# Altium integrated library all_in_one_library.IntLib: 677 symbols (part 3 of 3)
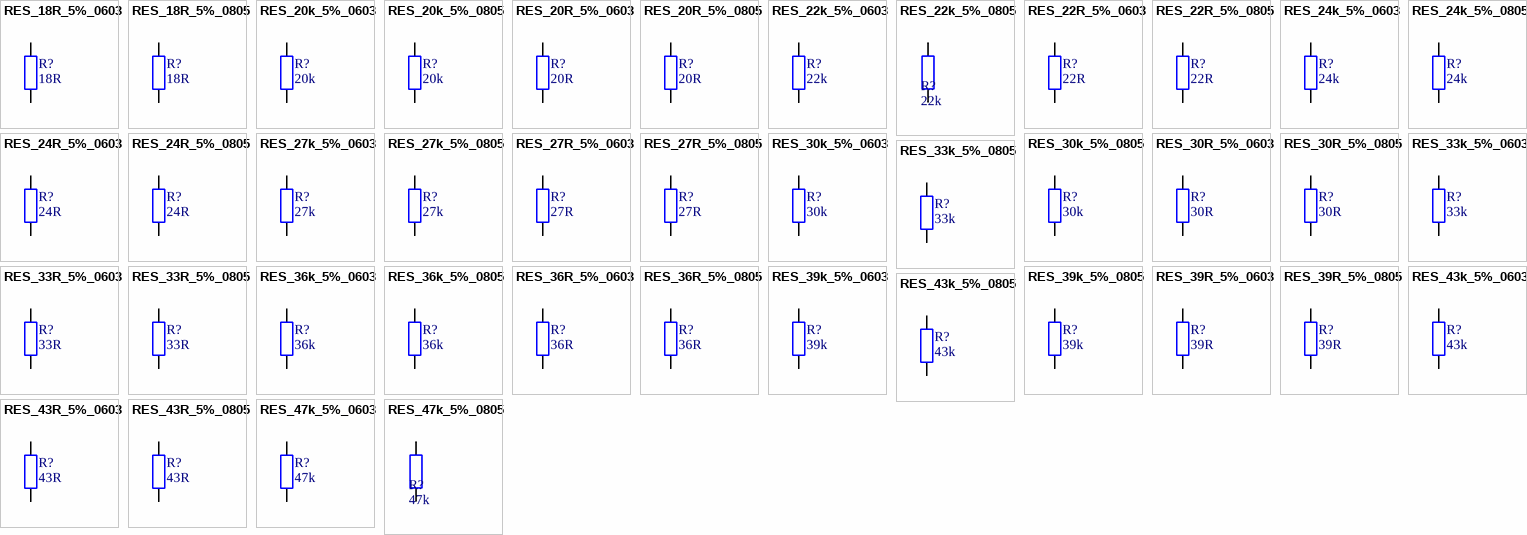
[diagram p19: symbols RES_18R_5%_0603 to RES_47k_5%_0805]

## RES_30k_5%_0603
designator R?, comment value 30k  (hidden comment: Thick film)
30000.00; Tolerance [%]: ±5; Power Rating [W]: 0.1; Case [EIA]: 0603; Case [Metric]: 1608; Value [Ω]: 30000.00
footprint RES_0603
pins: 1, 2
1 alternate drawing of the same symbol

## RES_30k_5%_0805
designator R?, comment value 30k  (hidden comment: Thick film)
30000.00; Tolerance [%]: ±5; Power Rating [W]: 0.1; Case [EIA]: 0805; Case [Metric]: 2012; Value [Ω]: 30000.00
footprint RES_0805
pins: 1, 2
1 alternate drawing of the same symbol

## RES_30R_5%_0603
designator R?, comment value 30R  (hidden comment: Thick film)
30.00; Tolerance [%]: ±5; Power Rating [W]: 0.1; Case [EIA]: 0603; Case [Metric]: 1608; Value [Ω]: 30.00
footprint RES_0603
pins: 1, 2
1 alternate drawing of the same symbol

## RES_30R_5%_0805
designator R?, comment value 30R  (hidden comment: Thick film)
30.00; Tolerance [%]: ±5; Power Rating [W]: 0.1; Case [EIA]: 0805; Case [Metric]: 2012; Value [Ω]: 30.00
footprint RES_0805
pins: 1, 2
1 alternate drawing of the same symbol

## RES_33k_5%_0603
designator R?, comment value 33k  (hidden comment: Thick film)
33000.00; Tolerance [%]: ±5; Power Rating [W]: 0.1; Case [EIA]: 0603; Case [Metric]: 1608; Value [Ω]: 33000.00
footprint RES_0603
pins: 1, 2
1 alternate drawing of the same symbol

## RES_33k_5%_0805
designator R?, comment value 33k  (hidden comment: Thick film)
33000.00; Tolerance [%]: ±5; Power Rating [W]: 0.1; Case [EIA]: 0805; Case [Metric]: 2012; Value [Ω]: 33000.00
footprint RES_0805
pins: 1, 2
1 alternate drawing of the same symbol

## RES_33R_5%_0603
designator R?, comment value 33R  (hidden comment: Thick film)
33.00; Tolerance [%]: ±5; Power Rating [W]: 0.1; Case [EIA]: 0603; Case [Metric]: 1608; Value [Ω]: 33.00
footprint RES_0603
pins: 1, 2
1 alternate drawing of the same symbol

## RES_33R_5%_0805
designator R?, comment value 33R  (hidden comment: Thick film)
33.00; Tolerance [%]: ±5; Power Rating [W]: 0.1; Case [EIA]: 0805; Case [Metric]: 2012; Value [Ω]: 33.00
footprint RES_0805
pins: 1, 2
1 alternate drawing of the same symbol

## RES_36k_5%_0603
designator R?, comment value 36k  (hidden comment: Thick film)
36000.00; Tolerance [%]: ±5; Power Rating [W]: 0.1; Case [EIA]: 0603; Case [Metric]: 1608; Value [Ω]: 36000.00
footprint RES_0603
pins: 1, 2
1 alternate drawing of the same symbol

## RES_36k_5%_0805
designator R?, comment value 36k  (hidden comment: Thick film)
36000.00; Tolerance [%]: ±5; Power Rating [W]: 0.1; Case [EIA]: 0805; Case [Metric]: 2012; Value [Ω]: 36000.00
footprint RES_0805
pins: 1, 2
1 alternate drawing of the same symbol

## RES_36R_5%_0603
designator R?, comment value 36R  (hidden comment: Thick film)
36.00; Tolerance [%]: ±5; Power Rating [W]: 0.1; Case [EIA]: 0603; Case [Metric]: 1608; Value [Ω]: 36.00
footprint RES_0603
pins: 1, 2
1 alternate drawing of the same symbol

## RES_36R_5%_0805
designator R?, comment value 36R  (hidden comment: Thick film)
36.00; Tolerance [%]: ±5; Power Rating [W]: 0.1; Case [EIA]: 0805; Case [Metric]: 2012; Value [Ω]: 36.00
footprint RES_0805
pins: 1, 2
1 alternate drawing of the same symbol

## RES_39k_5%_0603
designator R?, comment value 39k  (hidden comment: Thick film)
39000.00; Tolerance [%]: ±5; Power Rating [W]: 0.1; Case [EIA]: 0603; Case [Metric]: 1608; Value [Ω]: 39000.00
footprint RES_0603
pins: 1, 2
1 alternate drawing of the same symbol

## RES_39k_5%_0805
designator R?, comment value 39k  (hidden comment: Thick film)
39000.00; Tolerance [%]: ±5; Power Rating [W]: 0.1; Case [EIA]: 0805; Case [Metric]: 2012; Value [Ω]: 39000.00
footprint RES_0805
pins: 1, 2
1 alternate drawing of the same symbol

## RES_39R_5%_0603
designator R?, comment value 39R  (hidden comment: Thick film)
39.00; Tolerance [%]: ±5; Power Rating [W]: 0.1; Case [EIA]: 0603; Case [Metric]: 1608; Value [Ω]: 39.00
footprint RES_0603
pins: 1, 2
1 alternate drawing of the same symbol

## RES_39R_5%_0805
designator R?, comment value 39R  (hidden comment: Thick film)
39.00; Tolerance [%]: ±5; Power Rating [W]: 0.1; Case [EIA]: 0805; Case [Metric]: 2012; Value [Ω]: 39.00
footprint RES_0805
pins: 1, 2
1 alternate drawing of the same symbol

## RES_43k_5%_0603
designator R?, comment value 43k  (hidden comment: Thick film)
43000.00; Tolerance [%]: ±5; Power Rating [W]: 0.1; Case [EIA]: 0603; Case [Metric]: 1608; Value [Ω]: 43000.00
footprint RES_0603
pins: 1, 2
1 alternate drawing of the same symbol

## RES_43k_5%_0805
designator R?, comment value 43k  (hidden comment: Thick film)
43000.00; Tolerance [%]: ±5; Power Rating [W]: 0.1; Case [EIA]: 0805; Case [Metric]: 2012; Value [Ω]: 43000.00
footprint RES_0805
pins: 1, 2
1 alternate drawing of the same symbol

## RES_43R_5%_0603
designator R?, comment value 43R  (hidden comment: Thick film)
43.00; Tolerance [%]: ±5; Power Rating [W]: 0.1; Case [EIA]: 0603; Case [Metric]: 1608; Value [Ω]: 43.00
footprint RES_0603
pins: 1, 2
1 alternate drawing of the same symbol

## RES_43R_5%_0805
designator R?, comment value 43R  (hidden comment: Thick film)
43.00; Tolerance [%]: ±5; Power Rating [W]: 0.1; Case [EIA]: 0805; Case [Metric]: 2012; Value [Ω]: 43.00
footprint RES_0805
pins: 1, 2
1 alternate drawing of the same symbol

## RES_47k_5%_0603
designator R?, comment value 47k  (hidden comment: Thick film)
47000.00; Tolerance [%]: ±5; Power Rating [W]: 0.1; Case [EIA]: 0603; Case [Metric]: 1608; Value [Ω]: 47000.00
footprint RES_0603
pins: 1, 2
1 alternate drawing of the same symbol

## RES_47k_5%_0805
designator R?, comment value 47k  (hidden comment: Thick film)
47000.00; Tolerance [%]: ±5; Power Rating [W]: 0.1; Case [EIA]: 0805; Case [Metric]: 2012; Value [Ω]: 47000.00
footprint RES_0805
pins: 1, 2
1 alternate drawing of the same symbol

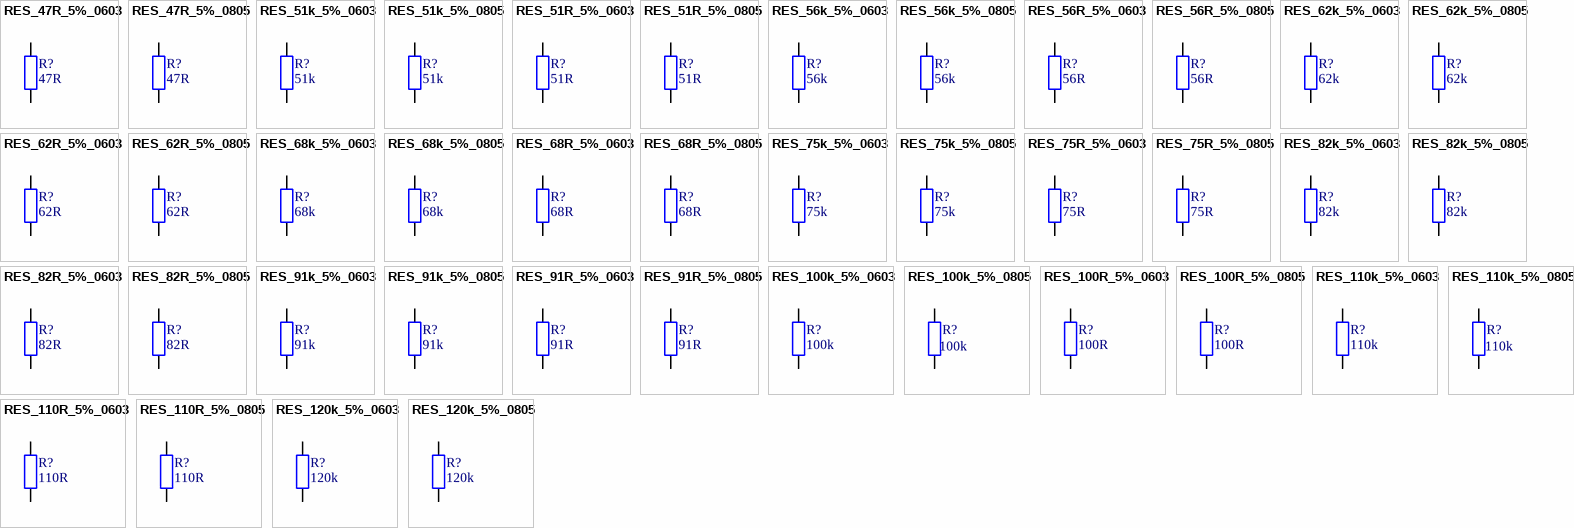
[diagram p13: symbols RES_47R_5%_0603 to RES_120k_5%_0805]

## RES_47R_5%_0603
designator R?, comment value 47R  (hidden comment: Thick film)
47.00; Tolerance [%]: ±5; Power Rating [W]: 0.1; Case [EIA]: 0603; Case [Metric]: 1608; Value [Ω]: 47.00
footprint RES_0603
pins: 1, 2
1 alternate drawing of the same symbol

## RES_47R_5%_0805
designator R?, comment value 47R  (hidden comment: Thick film)
47.00; Tolerance [%]: ±5; Power Rating [W]: 0.1; Case [EIA]: 0805; Case [Metric]: 2012; Value [Ω]: 47.00
footprint RES_0805
pins: 1, 2
1 alternate drawing of the same symbol

## RES_51k_5%_0603
designator R?, comment value 51k  (hidden comment: Thick film)
51000.00; Tolerance [%]: ±5; Power Rating [W]: 0.1; Case [EIA]: 0603; Case [Metric]: 1608; Value [Ω]: 51000.00
footprint RES_0603
pins: 1, 2
1 alternate drawing of the same symbol

## RES_51k_5%_0805
designator R?, comment value 51k  (hidden comment: Thick film)
51000.00; Tolerance [%]: ±5; Power Rating [W]: 0.1; Case [EIA]: 0805; Case [Metric]: 2012; Value [Ω]: 51000.00
footprint RES_0805
pins: 1, 2
1 alternate drawing of the same symbol

## RES_51R_5%_0603
designator R?, comment value 51R  (hidden comment: Thick film)
51.00; Tolerance [%]: ±5; Power Rating [W]: 0.1; Case [EIA]: 0603; Case [Metric]: 1608; Value [Ω]: 51.00
footprint RES_0603
pins: 1, 2
1 alternate drawing of the same symbol

## RES_51R_5%_0805
designator R?, comment value 51R  (hidden comment: Thick film)
51.00; Tolerance [%]: ±5; Power Rating [W]: 0.1; Case [EIA]: 0805; Case [Metric]: 2012; Value [Ω]: 51.00
footprint RES_0805
pins: 1, 2
1 alternate drawing of the same symbol

## RES_56k_5%_0603
designator R?, comment value 56k  (hidden comment: Thick film)
56000.00; Tolerance [%]: ±5; Power Rating [W]: 0.1; Case [EIA]: 0603; Case [Metric]: 1608; Value [Ω]: 56000.00
footprint RES_0603
pins: 1, 2
1 alternate drawing of the same symbol

## RES_56k_5%_0805
designator R?, comment value 56k  (hidden comment: Thick film)
56000.00; Tolerance [%]: ±5; Power Rating [W]: 0.1; Case [EIA]: 0805; Case [Metric]: 2012; Value [Ω]: 56000.00
footprint RES_0805
pins: 1, 2
1 alternate drawing of the same symbol

## RES_56R_5%_0603
designator R?, comment value 56R  (hidden comment: Thick film)
56.00; Tolerance [%]: ±5; Power Rating [W]: 0.1; Case [EIA]: 0603; Case [Metric]: 1608; Value [Ω]: 56.00
footprint RES_0603
pins: 1, 2
1 alternate drawing of the same symbol

## RES_56R_5%_0805
designator R?, comment value 56R  (hidden comment: Thick film)
56.00; Tolerance [%]: ±5; Power Rating [W]: 0.1; Case [EIA]: 0805; Case [Metric]: 2012; Value [Ω]: 56.00
footprint RES_0805
pins: 1, 2
1 alternate drawing of the same symbol

## RES_62k_5%_0603
designator R?, comment value 62k  (hidden comment: Thick film)
62000.00; Tolerance [%]: ±5; Power Rating [W]: 0.1; Case [EIA]: 0603; Case [Metric]: 1608; Value [Ω]: 62000.00
footprint RES_0603
pins: 1, 2
1 alternate drawing of the same symbol

## RES_62k_5%_0805
designator R?, comment value 62k  (hidden comment: Thick film)
62000.00; Tolerance [%]: ±5; Power Rating [W]: 0.1; Case [EIA]: 0805; Case [Metric]: 2012; Value [Ω]: 62000.00
footprint RES_0805
pins: 1, 2
1 alternate drawing of the same symbol

## RES_62R_5%_0603
designator R?, comment value 62R  (hidden comment: Thick film)
62.00; Tolerance [%]: ±5; Power Rating [W]: 0.1; Case [EIA]: 0603; Case [Metric]: 1608; Value [Ω]: 62.00
footprint RES_0603
pins: 1, 2
1 alternate drawing of the same symbol

## RES_62R_5%_0805
designator R?, comment value 62R  (hidden comment: Thick film)
62.00; Tolerance [%]: ±5; Power Rating [W]: 0.1; Case [EIA]: 0805; Case [Metric]: 2012; Value [Ω]: 62.00
footprint RES_0805
pins: 1, 2
1 alternate drawing of the same symbol

## RES_68k_5%_0603
designator R?, comment value 68k  (hidden comment: Thick film)
68000.00; Tolerance [%]: ±5; Power Rating [W]: 0.1; Case [EIA]: 0603; Case [Metric]: 1608; Value [Ω]: 68000.00
footprint RES_0603
pins: 1, 2
1 alternate drawing of the same symbol

## RES_68k_5%_0805
designator R?, comment value 68k  (hidden comment: Thick film)
68000.00; Tolerance [%]: ±5; Power Rating [W]: 0.1; Case [EIA]: 0805; Case [Metric]: 2012; Value [Ω]: 68000.00
footprint RES_0805
pins: 1, 2
1 alternate drawing of the same symbol

## RES_68R_5%_0603
designator R?, comment value 68R  (hidden comment: Thick film)
68.00; Tolerance [%]: ±5; Power Rating [W]: 0.1; Case [EIA]: 0603; Case [Metric]: 1608; Value [Ω]: 68.00
footprint RES_0603
pins: 1, 2
1 alternate drawing of the same symbol

## RES_68R_5%_0805
designator R?, comment value 68R  (hidden comment: Thick film)
68.00; Tolerance [%]: ±5; Power Rating [W]: 0.1; Case [EIA]: 0805; Case [Metric]: 2012; Value [Ω]: 68.00
footprint RES_0805
pins: 1, 2
1 alternate drawing of the same symbol

## RES_75k_5%_0603
designator R?, comment value 75k  (hidden comment: Thick film)
75000.00; Tolerance [%]: ±5; Power Rating [W]: 0.1; Case [EIA]: 0603; Case [Metric]: 1608; Value [Ω]: 75000.00
footprint RES_0603
pins: 1, 2
1 alternate drawing of the same symbol

## RES_75k_5%_0805
designator R?, comment value 75k  (hidden comment: Thick film)
75000.00; Tolerance [%]: ±5; Power Rating [W]: 0.1; Case [EIA]: 0805; Case [Metric]: 2012; Value [Ω]: 75000.00
footprint RES_0805
pins: 1, 2
1 alternate drawing of the same symbol

## RES_75R_5%_0603
designator R?, comment value 75R  (hidden comment: Thick film)
75.00; Tolerance [%]: ±5; Power Rating [W]: 0.1; Case [EIA]: 0603; Case [Metric]: 1608; Value [Ω]: 75.00
footprint RES_0603
pins: 1, 2
1 alternate drawing of the same symbol

## RES_75R_5%_0805
designator R?, comment value 75R  (hidden comment: Thick film)
75.00; Tolerance [%]: ±5; Power Rating [W]: 0.1; Case [EIA]: 0805; Case [Metric]: 2012; Value [Ω]: 75.00
footprint RES_0805
pins: 1, 2
1 alternate drawing of the same symbol

## RES_82k_5%_0603
designator R?, comment value 82k  (hidden comment: Thick film)
82000.00; Tolerance [%]: ±5; Power Rating [W]: 0.1; Case [EIA]: 0603; Case [Metric]: 1608; Value [Ω]: 82000.00
footprint RES_0603
pins: 1, 2
1 alternate drawing of the same symbol

## RES_82k_5%_0805
designator R?, comment value 82k  (hidden comment: Thick film)
82000.00; Tolerance [%]: ±5; Power Rating [W]: 0.1; Case [EIA]: 0805; Case [Metric]: 2012; Value [Ω]: 82000.00
footprint RES_0805
pins: 1, 2
1 alternate drawing of the same symbol

## RES_82R_5%_0603
designator R?, comment value 82R  (hidden comment: Thick film)
82.00; Tolerance [%]: ±5; Power Rating [W]: 0.1; Case [EIA]: 0603; Case [Metric]: 1608; Value [Ω]: 82.00
footprint RES_0603
pins: 1, 2
1 alternate drawing of the same symbol

## RES_82R_5%_0805
designator R?, comment value 82R  (hidden comment: Thick film)
82.00; Tolerance [%]: ±5; Power Rating [W]: 0.1; Case [EIA]: 0805; Case [Metric]: 2012; Value [Ω]: 82.00
footprint RES_0805
pins: 1, 2
1 alternate drawing of the same symbol

## RES_91k_5%_0603
designator R?, comment value 91k  (hidden comment: Thick film)
91000.00; Tolerance [%]: ±5; Power Rating [W]: 0.1; Case [EIA]: 0603; Case [Metric]: 1608; Value [Ω]: 91000.00
footprint RES_0603
pins: 1, 2
1 alternate drawing of the same symbol

## RES_91k_5%_0805
designator R?, comment value 91k  (hidden comment: Thick film)
91000.00; Tolerance [%]: ±5; Power Rating [W]: 0.1; Case [EIA]: 0805; Case [Metric]: 2012; Value [Ω]: 91000.00
footprint RES_0805
pins: 1, 2
1 alternate drawing of the same symbol

## RES_91R_5%_0603
designator R?, comment value 91R  (hidden comment: Thick film)
91.00; Tolerance [%]: ±5; Power Rating [W]: 0.1; Case [EIA]: 0603; Case [Metric]: 1608; Value [Ω]: 91.00
footprint RES_0603
pins: 1, 2
1 alternate drawing of the same symbol

## RES_91R_5%_0805
designator R?, comment value 91R  (hidden comment: Thick film)
91.00; Tolerance [%]: ±5; Power Rating [W]: 0.1; Case [EIA]: 0805; Case [Metric]: 2012; Value [Ω]: 91.00
footprint RES_0805
pins: 1, 2
1 alternate drawing of the same symbol

## RES_100k_5%_0603
designator R?, comment value 100k  (hidden comment: Thick film)
100000.00; Tolerance [%]: ±5; Power Rating [W]: 0.1; Case [EIA]: 0603; Case [Metric]: 1608; Value [Ω]: 100000.00
footprint RES_0603
pins: 1, 2
1 alternate drawing of the same symbol

## RES_100k_5%_0805
designator R?, comment value 100k  (hidden comment: Thick film)
100000.00; Tolerance [%]: ±5; Power Rating [W]: 0.1; Case [EIA]: 0805; Case [Metric]: 2012; Value [Ω]: 100000.00
footprint RES_0805
pins: 1, 2
1 alternate drawing of the same symbol

## RES_100R_5%_0603
designator R?, comment value 100R  (hidden comment: Thick film)
100.00; Tolerance [%]: ±5; Power Rating [W]: 0.1; Case [EIA]: 0603; Case [Metric]: 1608; Value [Ω]: 100.00
footprint RES_0603
pins: 1, 2
1 alternate drawing of the same symbol

## RES_100R_5%_0805
designator R?, comment value 100R  (hidden comment: Thick film)
100.00; Tolerance [%]: ±5; Power Rating [W]: 0.1; Case [EIA]: 0805; Case [Metric]: 2012; Value [Ω]: 100.00
footprint RES_0805
pins: 1, 2
1 alternate drawing of the same symbol

## RES_110k_5%_0603
designator R?, comment value 110k  (hidden comment: Thick film)
110000.00; Tolerance [%]: ±5; Power Rating [W]: 0.1; Case [EIA]: 0603; Case [Metric]: 1608; Value [Ω]: 110000.00
footprint RES_0603
pins: 1, 2
1 alternate drawing of the same symbol

## RES_110k_5%_0805
designator R?, comment value 110k  (hidden comment: Thick film)
110000.00; Tolerance [%]: ±5; Power Rating [W]: 0.1; Case [EIA]: 0805; Case [Metric]: 2012; Value [Ω]: 110000.00
footprint RES_0805
pins: 1, 2
1 alternate drawing of the same symbol

## RES_110R_5%_0603
designator R?, comment value 110R  (hidden comment: Thick film)
110.00; Tolerance [%]: ±5; Power Rating [W]: 0.1; Case [EIA]: 0603; Case [Metric]: 1608; Value [Ω]: 110.00
footprint RES_0603
pins: 1, 2
1 alternate drawing of the same symbol

## RES_110R_5%_0805
designator R?, comment value 110R  (hidden comment: Thick film)
110.00; Tolerance [%]: ±5; Power Rating [W]: 0.1; Case [EIA]: 0805; Case [Metric]: 2012; Value [Ω]: 110.00
footprint RES_0805
pins: 1, 2
1 alternate drawing of the same symbol

## RES_120k_5%_0603
designator R?, comment value 120k  (hidden comment: Thick film)
120000.00; Tolerance [%]: ±5; Power Rating [W]: 0.1; Case [EIA]: 0603; Case [Metric]: 1608; Value [Ω]: 120000.00
footprint RES_0603
pins: 1, 2
1 alternate drawing of the same symbol

## RES_120k_5%_0805
designator R?, comment value 120k  (hidden comment: Thick film)
120000.00; Tolerance [%]: ±5; Power Rating [W]: 0.1; Case [EIA]: 0805; Case [Metric]: 2012; Value [Ω]: 120000.00
footprint RES_0805
pins: 1, 2
1 alternate drawing of the same symbol

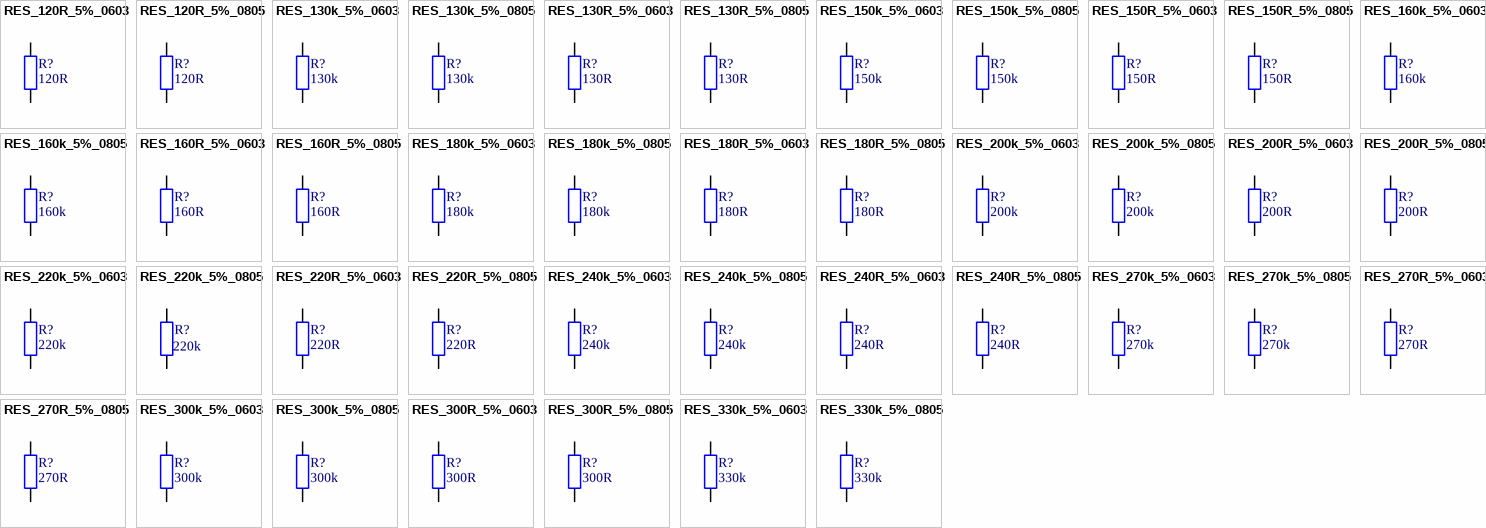
[diagram p14: symbols RES_120R_5%_0603 to RES_330k_5%_0805]

## RES_120R_5%_0603
designator R?, comment value 120R  (hidden comment: Thick film)
120.00; Tolerance [%]: ±5; Power Rating [W]: 0.1; Case [EIA]: 0603; Case [Metric]: 1608; Value [Ω]: 120.00
footprint RES_0603
pins: 1, 2
1 alternate drawing of the same symbol

## RES_120R_5%_0805
designator R?, comment value 120R  (hidden comment: Thick film)
120.00; Tolerance [%]: ±5; Power Rating [W]: 0.1; Case [EIA]: 0805; Case [Metric]: 2012; Value [Ω]: 120.00
footprint RES_0805
pins: 1, 2
1 alternate drawing of the same symbol

## RES_130k_5%_0603
designator R?, comment value 130k  (hidden comment: Thick film)
130000.00; Tolerance [%]: ±5; Power Rating [W]: 0.1; Case [EIA]: 0603; Case [Metric]: 1608; Value [Ω]: 130000.00
footprint RES_0603
pins: 1, 2
1 alternate drawing of the same symbol

## RES_130k_5%_0805
designator R?, comment value 130k  (hidden comment: Thick film)
130000.00; Tolerance [%]: ±5; Power Rating [W]: 0.1; Case [EIA]: 0805; Case [Metric]: 2012; Value [Ω]: 130000.00
footprint RES_0805
pins: 1, 2
1 alternate drawing of the same symbol

## RES_130R_5%_0603
designator R?, comment value 130R  (hidden comment: Thick film)
130.00; Tolerance [%]: ±5; Power Rating [W]: 0.1; Case [EIA]: 0603; Case [Metric]: 1608; Value [Ω]: 130.00
footprint RES_0603
pins: 1, 2
1 alternate drawing of the same symbol

## RES_130R_5%_0805
designator R?, comment value 130R  (hidden comment: Thick film)
130.00; Tolerance [%]: ±5; Power Rating [W]: 0.1; Case [EIA]: 0805; Case [Metric]: 2012; Value [Ω]: 130.00
footprint RES_0805
pins: 1, 2
1 alternate drawing of the same symbol

## RES_150k_5%_0603
designator R?, comment value 150k  (hidden comment: Thick film)
150000.00; Tolerance [%]: ±5; Power Rating [W]: 0.1; Case [EIA]: 0603; Case [Metric]: 1608; Value [Ω]: 150000.00
footprint RES_0603
pins: 1, 2
1 alternate drawing of the same symbol

## RES_150k_5%_0805
designator R?, comment value 150k  (hidden comment: Thick film)
150000.00; Tolerance [%]: ±5; Power Rating [W]: 0.1; Case [EIA]: 0805; Case [Metric]: 2012; Value [Ω]: 150000.00
footprint RES_0805
pins: 1, 2
1 alternate drawing of the same symbol

## RES_150R_5%_0603
designator R?, comment value 150R  (hidden comment: Thick film)
150.00; Tolerance [%]: ±5; Power Rating [W]: 0.1; Case [EIA]: 0603; Case [Metric]: 1608; Value [Ω]: 150.00
footprint RES_0603
pins: 1, 2
1 alternate drawing of the same symbol

## RES_150R_5%_0805
designator R?, comment value 150R  (hidden comment: Thick film)
150.00; Tolerance [%]: ±5; Power Rating [W]: 0.1; Case [EIA]: 0805; Case [Metric]: 2012; Value [Ω]: 150.00
footprint RES_0805
pins: 1, 2
1 alternate drawing of the same symbol

## RES_160k_5%_0603
designator R?, comment value 160k  (hidden comment: Thick film)
160000.00; Tolerance [%]: ±5; Power Rating [W]: 0.1; Case [EIA]: 0603; Case [Metric]: 1608; Value [Ω]: 160000.00
footprint RES_0603
pins: 1, 2
1 alternate drawing of the same symbol

## RES_160k_5%_0805
designator R?, comment value 160k  (hidden comment: Thick film)
160000.00; Tolerance [%]: ±5; Power Rating [W]: 0.1; Case [EIA]: 0805; Case [Metric]: 2012; Value [Ω]: 160000.00
footprint RES_0805
pins: 1, 2
1 alternate drawing of the same symbol

## RES_160R_5%_0603
designator R?, comment value 160R  (hidden comment: Thick film)
160.00; Tolerance [%]: ±5; Power Rating [W]: 0.1; Case [EIA]: 0603; Case [Metric]: 1608; Value [Ω]: 160.00
footprint RES_0603
pins: 1, 2
1 alternate drawing of the same symbol

## RES_160R_5%_0805
designator R?, comment value 160R  (hidden comment: Thick film)
160.00; Tolerance [%]: ±5; Power Rating [W]: 0.1; Case [EIA]: 0805; Case [Metric]: 2012; Value [Ω]: 160.00
footprint RES_0805
pins: 1, 2
1 alternate drawing of the same symbol

## RES_180k_5%_0603
designator R?, comment value 180k  (hidden comment: Thick film)
180000.00; Tolerance [%]: ±5; Power Rating [W]: 0.1; Case [EIA]: 0603; Case [Metric]: 1608; Value [Ω]: 180000.00
footprint RES_0603
pins: 1, 2
1 alternate drawing of the same symbol

## RES_180k_5%_0805
designator R?, comment value 180k  (hidden comment: Thick film)
180000.00; Tolerance [%]: ±5; Power Rating [W]: 0.1; Case [EIA]: 0805; Case [Metric]: 2012; Value [Ω]: 180000.00
footprint RES_0805
pins: 1, 2
1 alternate drawing of the same symbol

## RES_180R_5%_0603
designator R?, comment value 180R  (hidden comment: Thick film)
180.00; Tolerance [%]: ±5; Power Rating [W]: 0.1; Case [EIA]: 0603; Case [Metric]: 1608; Value [Ω]: 180.00
footprint RES_0603
pins: 1, 2
1 alternate drawing of the same symbol

## RES_180R_5%_0805
designator R?, comment value 180R  (hidden comment: Thick film)
180.00; Tolerance [%]: ±5; Power Rating [W]: 0.1; Case [EIA]: 0805; Case [Metric]: 2012; Value [Ω]: 180.00
footprint RES_0805
pins: 1, 2
1 alternate drawing of the same symbol

## RES_200k_5%_0603
designator R?, comment value 200k  (hidden comment: Thick film)
200000.00; Tolerance [%]: ±5; Power Rating [W]: 0.1; Case [EIA]: 0603; Case [Metric]: 1608; Value [Ω]: 200000.00
footprint RES_0603
pins: 1, 2
1 alternate drawing of the same symbol

## RES_200k_5%_0805
designator R?, comment value 200k  (hidden comment: Thick film)
200000.00; Tolerance [%]: ±5; Power Rating [W]: 0.1; Case [EIA]: 0805; Case [Metric]: 2012; Value [Ω]: 200000.00
footprint RES_0805
pins: 1, 2
1 alternate drawing of the same symbol

## RES_200R_5%_0603
designator R?, comment value 200R  (hidden comment: Thick film)
200.00; Tolerance [%]: ±5; Power Rating [W]: 0.1; Case [EIA]: 0603; Case [Metric]: 1608; Value [Ω]: 200.00
footprint RES_0603
pins: 1, 2
1 alternate drawing of the same symbol

## RES_200R_5%_0805
designator R?, comment value 200R  (hidden comment: Thick film)
200.00; Tolerance [%]: ±5; Power Rating [W]: 0.1; Case [EIA]: 0805; Case [Metric]: 2012; Value [Ω]: 200.00
footprint RES_0805
pins: 1, 2
1 alternate drawing of the same symbol

## RES_220k_5%_0603
designator R?, comment value 220k  (hidden comment: Thick film)
220000.00; Tolerance [%]: ±5; Power Rating [W]: 0.1; Case [EIA]: 0603; Case [Metric]: 1608; Value [Ω]: 220000.00
footprint RES_0603
pins: 1, 2
1 alternate drawing of the same symbol

## RES_220k_5%_0805
designator R?, comment value 220k  (hidden comment: Thick film)
220000.00; Tolerance [%]: ±5; Power Rating [W]: 0.1; Case [EIA]: 0805; Case [Metric]: 2012; Value [Ω]: 220000.00
footprint RES_0805
pins: 1, 2
1 alternate drawing of the same symbol

## RES_220R_5%_0603
designator R?, comment value 220R  (hidden comment: Thick film)
220.00; Tolerance [%]: ±5; Power Rating [W]: 0.1; Case [EIA]: 0603; Case [Metric]: 1608; Value [Ω]: 220.00
footprint RES_0603
pins: 1, 2
1 alternate drawing of the same symbol

## RES_220R_5%_0805
designator R?, comment value 220R  (hidden comment: Thick film)
220.00; Tolerance [%]: ±5; Power Rating [W]: 0.1; Case [EIA]: 0805; Case [Metric]: 2012; Value [Ω]: 220.00
footprint RES_0805
pins: 1, 2
1 alternate drawing of the same symbol

## RES_240k_5%_0603
designator R?, comment value 240k  (hidden comment: Thick film)
240000.00; Tolerance [%]: ±5; Power Rating [W]: 0.1; Case [EIA]: 0603; Case [Metric]: 1608; Value [Ω]: 240000.00
footprint RES_0603
pins: 1, 2
1 alternate drawing of the same symbol

## RES_240k_5%_0805
designator R?, comment value 240k  (hidden comment: Thick film)
240000.00; Tolerance [%]: ±5; Power Rating [W]: 0.1; Case [EIA]: 0805; Case [Metric]: 2012; Value [Ω]: 240000.00
footprint RES_0805
pins: 1, 2
1 alternate drawing of the same symbol

## RES_240R_5%_0603
designator R?, comment value 240R  (hidden comment: Thick film)
240.00; Tolerance [%]: ±5; Power Rating [W]: 0.1; Case [EIA]: 0603; Case [Metric]: 1608; Value [Ω]: 240.00
footprint RES_0603
pins: 1, 2
1 alternate drawing of the same symbol

## RES_240R_5%_0805
designator R?, comment value 240R  (hidden comment: Thick film)
240.00; Tolerance [%]: ±5; Power Rating [W]: 0.1; Case [EIA]: 0805; Case [Metric]: 2012; Value [Ω]: 240.00
footprint RES_0805
pins: 1, 2
1 alternate drawing of the same symbol

## RES_270k_5%_0603
designator R?, comment value 270k  (hidden comment: Thick film)
270000.00; Tolerance [%]: ±5; Power Rating [W]: 0.1; Case [EIA]: 0603; Case [Metric]: 1608; Value [Ω]: 270000.00
footprint RES_0603
pins: 1, 2
1 alternate drawing of the same symbol

## RES_270k_5%_0805
designator R?, comment value 270k  (hidden comment: Thick film)
270000.00; Tolerance [%]: ±5; Power Rating [W]: 0.1; Case [EIA]: 0805; Case [Metric]: 2012; Value [Ω]: 270000.00
footprint RES_0805
pins: 1, 2
1 alternate drawing of the same symbol

## RES_270R_5%_0603
designator R?, comment value 270R  (hidden comment: Thick film)
270.00; Tolerance [%]: ±5; Power Rating [W]: 0.1; Case [EIA]: 0603; Case [Metric]: 1608; Value [Ω]: 270.00
footprint RES_0603
pins: 1, 2
1 alternate drawing of the same symbol

## RES_270R_5%_0805
designator R?, comment value 270R  (hidden comment: Thick film)
270.00; Tolerance [%]: ±5; Power Rating [W]: 0.1; Case [EIA]: 0805; Case [Metric]: 2012; Value [Ω]: 270.00
footprint RES_0805
pins: 1, 2
1 alternate drawing of the same symbol

## RES_300k_5%_0603
designator R?, comment value 300k  (hidden comment: Thick film)
300000.00; Tolerance [%]: ±5; Power Rating [W]: 0.1; Case [EIA]: 0603; Case [Metric]: 1608; Value [Ω]: 300000.00
footprint RES_0603
pins: 1, 2
1 alternate drawing of the same symbol

## RES_300k_5%_0805
designator R?, comment value 300k  (hidden comment: Thick film)
300000.00; Tolerance [%]: ±5; Power Rating [W]: 0.1; Case [EIA]: 0805; Case [Metric]: 2012; Value [Ω]: 300000.00
footprint RES_0805
pins: 1, 2
1 alternate drawing of the same symbol

## RES_300R_5%_0603
designator R?, comment value 300R  (hidden comment: Thick film)
300.00; Tolerance [%]: ±5; Power Rating [W]: 0.1; Case [EIA]: 0603; Case [Metric]: 1608; Value [Ω]: 300.00
footprint RES_0603
pins: 1, 2
1 alternate drawing of the same symbol

## RES_300R_5%_0805
designator R?, comment value 300R  (hidden comment: Thick film)
300.00; Tolerance [%]: ±5; Power Rating [W]: 0.1; Case [EIA]: 0805; Case [Metric]: 2012; Value [Ω]: 300.00
footprint RES_0805
pins: 1, 2
1 alternate drawing of the same symbol

## RES_330k_5%_0603
designator R?, comment value 330k  (hidden comment: Thick film)
330000.00; Tolerance [%]: ±5; Power Rating [W]: 0.1; Case [EIA]: 0603; Case [Metric]: 1608; Value [Ω]: 330000.00
footprint RES_0603
pins: 1, 2
1 alternate drawing of the same symbol

## RES_330k_5%_0805
designator R?, comment value 330k  (hidden comment: Thick film)
330000.00; Tolerance [%]: ±5; Power Rating [W]: 0.1; Case [EIA]: 0805; Case [Metric]: 2012; Value [Ω]: 330000.00
footprint RES_0805
pins: 1, 2
1 alternate drawing of the same symbol
